# Altium footprint library master.PcbLib: 64 footprints (part 3 of 4)
Each footprint in its own frame and in the unit in brackets; x right, y up, seen from the top. Pads: shape width x height; smd on the part's side, far side on the other; paste and mask are expansions set on the pad; w line width, h text height; cw(c..) or ccw(c..) is an arc to the next point about the centre after c.
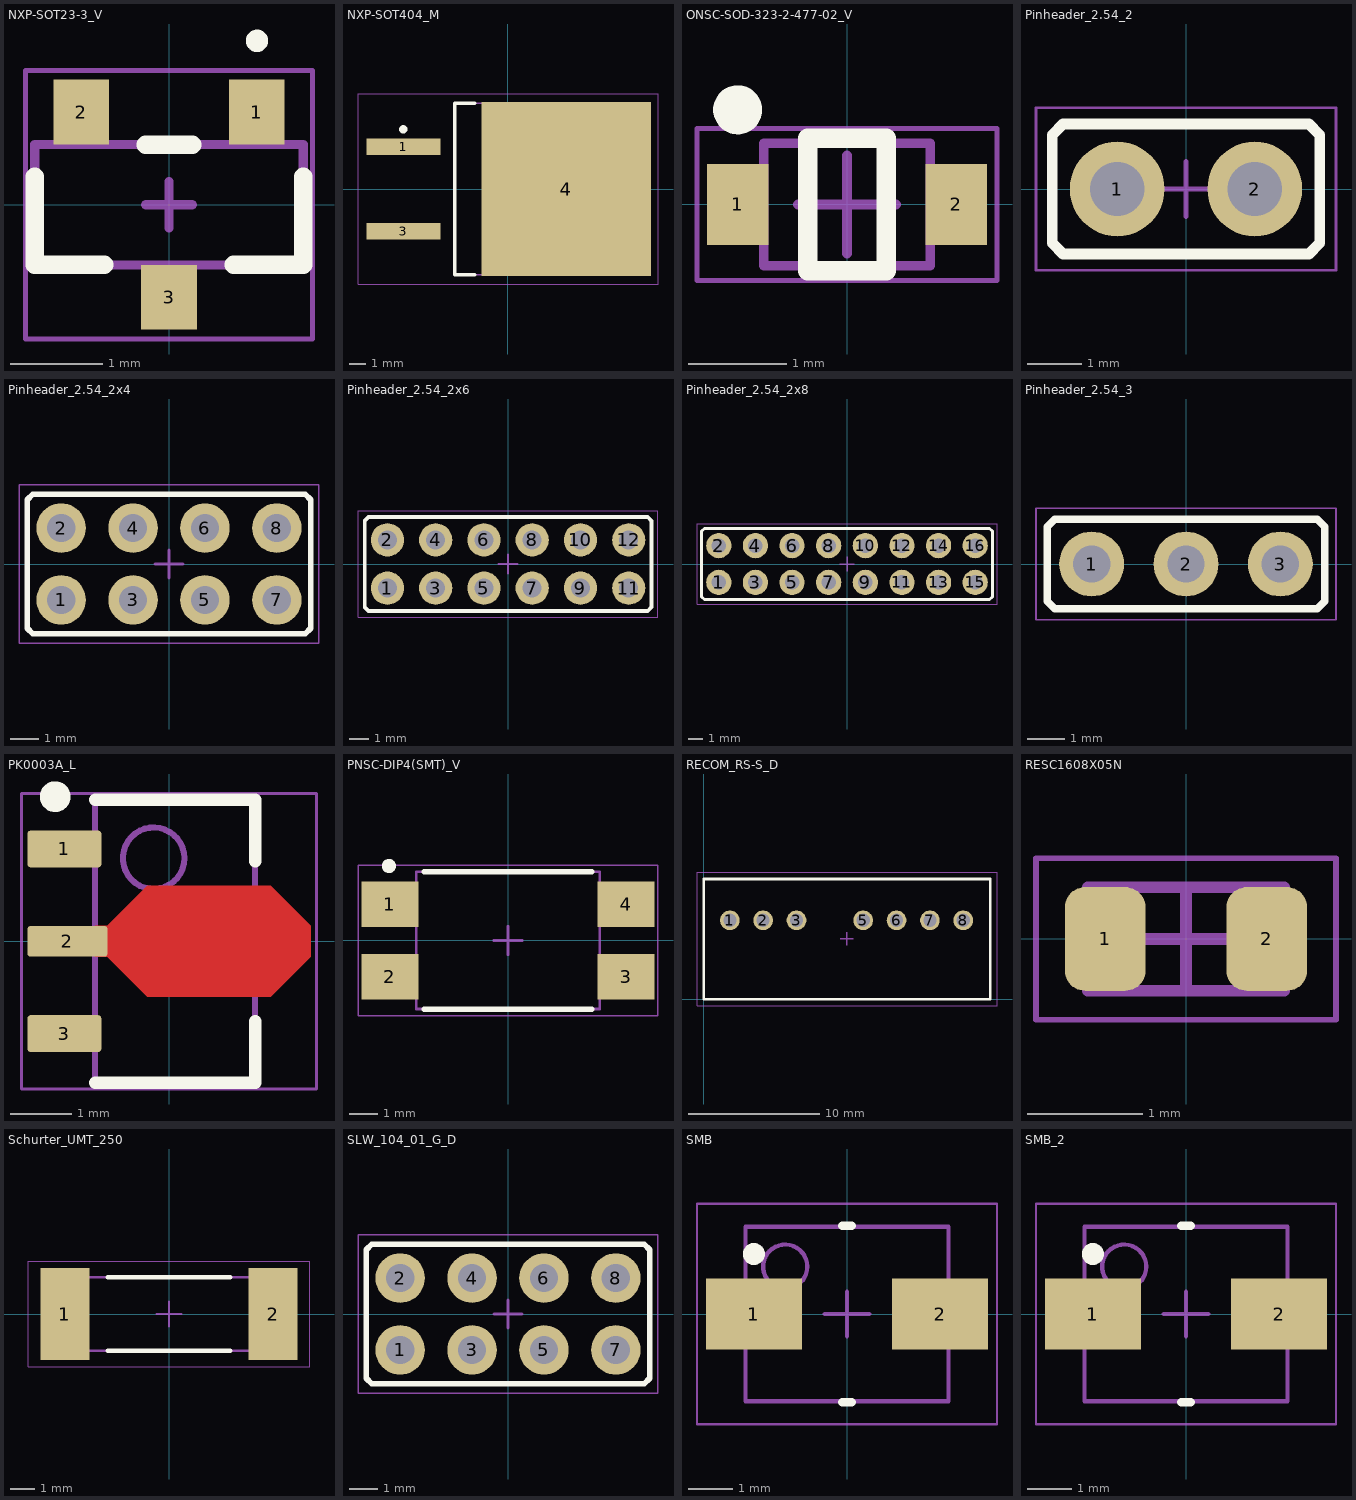
[diagram p2: the footprints below, top view; thin cyan lines are the x and y axes]

## NXP-SOT23-3_V [mm] "SOT23, 3-Leads, Body 1.3x2.9mm, Pitch 0.95mm"
height 1.1
pads (3):
  rect 0.6x0.7 smd paste-0.05: 1(0.95,1) 2(-0.95,1) 3(0,-1)
Top Overlay:
  circle w0.2: c0.95,1.77 r0.02
  lines w0.2: -1.45,0.304 -1.45,-0.65 -0.7,-0.65 ; -0.25,0.65 0.25,0.65 ; 0.7,-0.65 1.45,-0.65 1.45,0.304
Mechanical 13:
  lines w0.1: -1.45,-0.65 1.45,-0.65 1.45,0.65 -1.45,0.65 -1.45,-0.65
Mechanical 15:
  lines w0.05: -1.55,-1.45 -1.55,1.45 1.55,1.45 1.55,-1.45 -1.55,-1.45
  lines w0.1: -0.25,0 0.25,0 ; 0,-0.25 0,0.25
3D body: height 1.1, standoff 0, extent -1.45,-0.65 1.45,0.65

## NXP-SOT404_M [mm] "DPAK, 3-Leads, Body 10.3x9.8mm, Pitch 2.54mm, IPC Low Density"
height 4.5
pads (3):
  rect 4.45x1 smd: 1(-6.3,2.54) 3(-6.3,-2.54)
  rect 10.2x10.45 smd: 4(3.5,0)
Top Overlay:
  circle w0.25: c-6.3,3.59 r0.125
  lines w0.2: -2,-5.15 -3.2,-5.15 -3.2,5.15 -2,5.15
Mechanical 13:
  lines w0.1: -3.2,-5.15 -3.2,5.15 6.6,5.15 6.6,-5.15 -3.2,-5.15
Mechanical 15:
  lines w0.05: -9.025,-5.725 9.025,-5.725 9.025,5.725 -9.025,5.725 -9.025,-5.725
  lines w0.1: -0.5,0 0.5,0 ; 0,-0.5 0,0.5
3D body: height 4.5, standoff 0, extent -3.2,-5.15 6.6,5.15

## ONSC-SOD-323-2-477-02_V [mm] "SOD, 2-Leads, Body 1.7x1.25mm"
height 1.062
pads (2):
  rect 0.63x0.83 smd: 1(-1.115,0) 2(1.115,0)
Top Overlay:
  circle w0.25: c-1.115,0.965 r0.125
  lines w0.2: -0.4,-0.675 0.4,-0.675 0.4,0.675 -0.4,0.675 -0.4,-0.675
Mechanical 13:
  lines w0.1: -0.85,-0.625 0.85,-0.625 0.85,0.625 -0.85,0.625 -0.85,-0.625
Mechanical 15:
  lines w0.05: -1.53,-0.775 1.53,-0.775 1.53,0.775 -1.53,0.775 -1.53,-0.775
  lines w0.1: -0.5,0 0.5,0 ; 0,-0.5 0,0.5
3D body: height 1.06, standoff 0, extent -0.85,-0.625 0.85,0.625

## Pinheader_2.54_2 [mm] "Pinheader, 2.54mm, gerade"
height 8.7
pads (2):
  round 1.75 hole 1: 1(-1.27,0) 2(1.27,0)
Top Overlay:
  lines w0.2: -2.47,-1 -2.47,1 -2.27,1.2 2.27,1.2 2.47,1 2.47,-1 2.27,-1.2 -2.27,-1.2 -2.47,-1
Mechanical 13:
  lines w0.1: -2.47,-1 -2.47,1 -2.27,1.2 2.27,1.2 2.47,1 2.47,-1 2.27,-1.2 -2.27,-1.2 -2.47,-1
Mechanical 15:
  lines w0.05: -2.77,-1.5 -2.77,1.5 2.77,1.5 2.77,-1.5 -2.77,-1.5
  lines w0.1: -0.5,0 0.5,0 ; 0,-0.5 0,0.5
3D body "stiftleiste_254_gerade_2.stp": height 8.74, standoff -2.86, extent -2.54,-1.27 2.54,1.27

## Pinheader_2.54_2x4 [mm] "Pinheader, 2.54mm, gerade, 2-reihig"
height 8.7
pads (8):
  round 1.75 hole 1: 1(-3.81,-1.27) 2(-3.81,1.27) 3(-1.27,-1.27) 4(-1.27,1.27) 5(1.27,-1.27) 6(1.27,1.27) 7(3.81,-1.27) 8(3.81,1.27)
Top Overlay:
  lines w0.2: -5.01,-2.27 -5.01,2.27 -4.81,2.47 4.81,2.47 5.01,2.27 5.01,-2.27 4.81,-2.47 -4.81,-2.47 -5.01,-2.27
Mechanical 13:
  lines w0.1: -5.01,-2.27 -5.01,2.27 -4.81,2.47 4.81,2.47 5.01,2.27 5.01,-2.27 4.81,-2.47 -4.81,-2.47 -5.01,-2.27
Mechanical 15:
  lines w0.05: -5.3,-2.8 5.3,-2.8 5.3,2.8 -5.3,2.8 -5.3,-2.8
  lines w0.1: -0.5,0 0.5,0 ; 0,-0.5 0,0.5
3D body "stiftleiste_254_gerade_2x4.stp": height 8.74, standoff -2.86, extent -5.08,-2.54 5.08,2.54

## Pinheader_2.54_2x6 [mm] "Pinheader, 2.54mm, gerade, 2-reihig"
height 8.7
pads (12):
  round 1.75 hole 1: 1(-6.35,-1.27) 2(-6.35,1.27) 3(-3.81,-1.27) 4(-3.81,1.27) 5(-1.27,-1.27) 6(-1.27,1.27) 7(1.27,-1.27) 8(1.27,1.27) 9(3.81,-1.27) 10(3.81,1.27) 11(6.35,-1.27) 12(6.35,1.27)
Top Overlay:
  lines w0.2: -7.55,-2.27 -7.35,-2.47 7.35,-2.47 7.55,-2.27 7.55,2.27 7.35,2.47 -7.35,2.47 -7.55,2.27 -7.55,-2.27
Mechanical 13:
  lines w0.1: -7.55,-2.27 -7.35,-2.47 7.35,-2.47 7.55,-2.27 7.55,2.27 7.35,2.47 -7.35,2.47 -7.55,2.27 -7.55,-2.27
Mechanical 15:
  lines w0.05: 7.874,-2.801 -7.9,-2.794 -7.9,2.794 7.89,2.801 7.89,-2.8
  lines w0.1: -0.5,0 0.5,0 ; 0,-0.5 0,0.5
3D body "stiftleiste_254_gerade_2x6.stp": height 8.74, standoff -2.86, extent -7.62,-2.54 7.62,2.54

## Pinheader_2.54_2x8 [mm] "Pinheader, 2.54mm, gerade, 2-reihig"
height 8.7
pads (16):
  round 1.75 hole 1: 1(-8.89,-1.27) 2(-8.89,1.27) 3(-6.35,-1.27) 4(-6.35,1.27) 5(-3.81,-1.27) 6(-3.81,1.27) 7(-1.27,-1.27) 8(-1.27,1.27) 9(1.27,-1.27) 10(1.27,1.27) 11(3.81,-1.27) 12(3.81,1.27) 13(6.35,-1.27) 14(6.35,1.27) 15(8.89,-1.27) 16(8.89,1.27)
Top Overlay:
  lines w0.2: -10.09,-2.27 -9.89,-2.47 9.89,-2.47 10.09,-2.27 10.09,2.27 9.89,2.47 -9.89,2.47 -10.09,2.27 -10.09,-2.27
Mechanical 13:
  lines w0.1: -10.09,-2.27 -9.89,-2.47 9.89,-2.47 10.09,-2.27 10.09,2.27 9.89,2.47 -9.89,2.47 -10.09,2.27 -10.09,-2.27
Mechanical 15:
  lines w0.05: -10.4,-2.8 10.4,-2.8 10.4,2.8 -10.4,2.8 -10.4,-2.8
  lines w0.1: -0.5,0 0.5,0 ; 0,-0.5 0,0.5
3D body "stiftleiste_254_gerade_2x8.stp": height 8.74, standoff -2.86, extent -10.16,-2.54 10.16,2.54

## Pinheader_2.54_3 [mm] "Pinheader, 2.54mm, gerade"
height 8.7
pads (3):
  round 1.75 hole 1: 1(-2.54,0) 2(0,0) 3(2.54,0)
Top Overlay:
  lines w0.2: -3.74,-1 -3.54,-1.2 3.54,-1.2 3.74,-1 3.74,1 3.54,1.2 -3.54,1.2 -3.74,1 -3.74,-1
Mechanical 13:
  lines w0.1: -3.74,-1 -3.54,-1.2 3.54,-1.2 3.74,-1 3.74,1 3.54,1.2 -3.54,1.2 -3.74,1 -3.74,-1
Mechanical 15:
  lines w0.05: -4.04,-1.5 -4.04,1.5 4.04,1.5 4.04,-1.5 -4.04,-1.5
  lines w0.1: -0.5,0 0.5,0 ; 0,-0.5 0,0.5
3D body "stiftleiste_254_gerade_3.stp": height 8.74, standoff -2.86, extent -3.81,-1.27 3.81,1.27

## PK0003A_L [mm] "SOT89, 3-Leads, Body 4.6x2.6mm, Pitch 1.5mm, IPC High Density"
height 1.6
pads (3):
  rrect17% 1.2x0.6 smd: 1(-1.7,1.5) 3(-1.7,-1.5)
  rrect20% 1.3x0.5 smd: 2(-1.65,0)
Top Layer:
  region: -1,0.25 -0.35,0.9 1.65,0.9 2.3,0.25 2.3,-0.25 1.65,-0.9 -0.35,-0.9 -1,-0.25 -1.2,-0.25 -1.2,0.25
Top Overlay:
  circle w0.25: c-1.85,2.35 r0.125
  lines w0.2: -1.2,-2.3 1.4,-2.3 1.4,-1.3 ; -1.2,2.3 1.4,2.3 1.4,1.3
Mechanical 1:
  text ".Designator" at -0.254,0.381 h0.8
Mechanical 13:
  circle w0.1: c-0.25,1.35 r0.5
  lines w0.1: -1.2,-2.3 1.4,-2.3 1.4,2.3 -1.2,2.3 -1.2,-2.3
Mechanical 15:
  lines w0.05: -2.4,-2.4 2.4,-2.4 2.4,2.4 -2.4,2.4 -2.4,-2.4
  lines w0.1: -0.4,0 0.6,0 ; 0.1,-0.5 0.1,0.5
3D body "PK0003A.stp": height 1.6, standoff 0, extent -2.186,-2.3 2.186,2.3

## PNSC-DIP4(SMT)_V [mm] "DIP(SMT), 4-Leads, Body 6.4x4.78mm, Pitch 2.54mm"
height 3
pads (4):
  rect 2x1.6 smd: 1(-4.15,1.27) 2(-4.15,-1.27) 3(4.15,-1.27) 4(4.15,1.27)
Top Overlay:
  circle w0.25: c-4.189,2.62 r0.125
  lines w0.2: -2.948,-2.415 2.948,-2.415 ; -2.948,2.415 2.948,2.415
Mechanical 13:
  lines w0.1: -3.225,-2.415 3.225,-2.415 3.225,2.415 -3.225,2.415 -3.225,-2.415
Mechanical 15:
  lines w0.05: -5.275,-2.64 5.275,-2.64 5.275,2.64 -5.275,2.64 -5.275,-2.64
  lines w0.1: -0.5,0 0.5,0 ; 0,-0.5 0,0.5
3D body: height 3, standoff 0.2, extent -3.225,-2.415 3.225,2.415

## RECOM_RS-S_D [mm] "Recom DC/DC Converter"
height 11.1
pads (7):
  round 1.5 hole 1: 1(2,6) 2(4.54,6) 3(7.08,6) 5(12.16,6) 6(14.7,6) 7(17.24,6) 8(19.78,6)
Top Overlay:
  lines w0.2: 0,0 21.844,0 21.844,9.144 0,9.144 0,0
Mechanical 13:
  lines w0.1: 0,0 0,9.144 21.844,9.144 21.844,0 0,0
Mechanical 15:
  lines w0.05: -0.5,-0.5 22.352,-0.5 22.352,9.652 -0.5,9.652 -0.5,-0.5
  lines w0.1: 10.4,4.6 11.4,4.6 ; 10.9,4.1 10.9,5.1
3D body: height 11.1, standoff 0, extent 0,0 21.8,9.2

## RESC1608X05N [mm] "Chip Resistor, 2-Leads, Body 1,60x0,80mm, IPC Medium Density"
height 0.45
pads (2):
  rrect50% 0.7x0.9 smd: 1(-0.7,0) 2(0.7,0)
Mechanical 13:
  lines w0.1: -0.85,-0.45 0.85,-0.45 0.85,0.45 -0.85,0.45 -0.85,-0.45
Mechanical 15:
  lines w0.05: -1.3,-0.7 1.3,-0.7 1.3,0.7 -1.3,0.7 -1.3,-0.7
  lines w0.1: -0.45,0 0.45,0 ; 0,-0.45 0,0.45
3D body "RESC1608X05N.step": height 0.45, standoff 0, extent -0.85,-0.45 0.85,0.45

## Schurter_UMT_250 [mm] "Schurter UMT 250 Series Fuse"
height 3
pads (2):
  rect 2x3.75 smd: 1(-4.25,0) 2(4.25,0)
Top Overlay:
  lines w0.2: -2.5,-1.5 2.5,-1.5 ; -2.5,1.5 2.5,1.5
Mechanical 13:
  lines w0.1: -5.05,-1.5 -5.05,1.5 5.05,1.5 5.05,-1.5 -5.05,-1.5
Mechanical 15:
  lines w0.05: -5.75,-2.15 -5.75,2.15 5.75,2.15 5.75,-2.15 -5.75,-2.15
  lines w0.1: -0.5,0 0.5,0 ; 0,-0.5 0,0.5
3D body "INDC10130X30N.step": height 3, standoff 0, extent -5.05,-1.5 5.05,1.5

## SLW_104_01_G_D [mm] "Board-To-Board Connector, Dual, 2.54 mm, 8 Contacts, Receptacle, SLW Series, Through Hole, 2 Rows"
height 4.57
pads (8):
  round 1.75 hole 1: 1(-3.81,-1.27) 2(-3.81,1.27) 3(-1.27,-1.27) 4(-1.27,1.27) 5(1.27,-1.27) 6(1.27,1.27) 7(3.81,-1.27) 8(3.81,1.27)
Top Overlay:
  lines w0.2: -5.01,-2.27 -4.81,-2.47 4.81,-2.47 5.01,-2.27 5.01,2.27 4.81,2.47 -4.81,2.47 -5.01,2.27 -5.01,-2.27
Mechanical 13:
  lines w0.1: -5.01,-2.27 -4.81,-2.47 4.81,-2.47 5.01,-2.27 5.01,2.27 4.81,2.47 -4.81,2.47 -5.01,2.27 -5.01,-2.27
Mechanical 15:
  lines w0.05: -5.3,-2.8 5.3,-2.8 5.3,2.8 -5.3,2.8 -5.3,-2.8
  lines w0.1: -0.5,0 0.5,0 ; 0,-0.5 0,0.5
3D body "SLW-104-01-G-D.stp": height 4.57, standoff -2.92, extent -5.08,-2.477 5.08,2.476

## SMB [mm] "SMB Diode footprint"
height 2.45
pads (2):
  rect 2.18x1.62 smd: 1(-2.11,0) 2(2.11,0)
Top Overlay:
  circle w0.25: c-2.11,1.36 r0.125
  lines w0.2: -0.1,-2 0.1,-2 ; -0.1,2 0.1,2
Mechanical 13:
  circle w0.1: c-1.4,1.075 r0.5
  lines w0.1: -2.3,-1.975 -2.3,1.975 2.3,1.975 2.3,-1.975 -2.3,-1.975
Mechanical 15:
  lines w0.05: -3.4,-2.5 -3.4,2.5 3.4,2.5 3.4,-2.5 -3.4,-2.5
  lines w0.1: -0.5,0 0.5,0 ; 0,-0.5 0,0.5
3D body "SMB.step": height 2.45, standoff 0, extent -2.875,-1.975 2.875,1.975

## SMB_2 [mm]
pads (2):
  rect 2.18x1.62 smd: 1(-2.11,0) 2(2.11,0)
Top Overlay:
  circle w0.25: c-2.11,1.36 r0.125
  lines w0.2: -0.1,-2 0.1,-2 ; -0.1,2 0.1,2
Mechanical 13:
  circle w0.1: c-1.4,1.075 r0.5
  lines w0.1: -2.3,-1.975 2.3,-1.975 2.3,1.975 -2.3,1.975 -2.3,-1.975
Mechanical 15:
  lines w0.05: -3.4,-2.5 3.4,-2.5 3.4,2.5 -3.4,2.5 -3.4,-2.5
  lines w0.1: -0.5,0 0.5,0 ; 0,-0.5 0,0.5
3D body "SMB.step": height 2.45, standoff 0, extent -2.875,-1.975 2.875,1.975